# Altium footprint library mastermind.PCBLIB: 1061 footprints (part 1 of 67)
Each footprint in its own frame and in the unit in brackets; x right, y up, seen from the top. Pads: shape width x height; smd on the part's side, far side on the other; paste and mask are expansions set on the pad; w line width, h text height; cw(c..) or ccw(c..) is an arc to the next point about the centre after c.
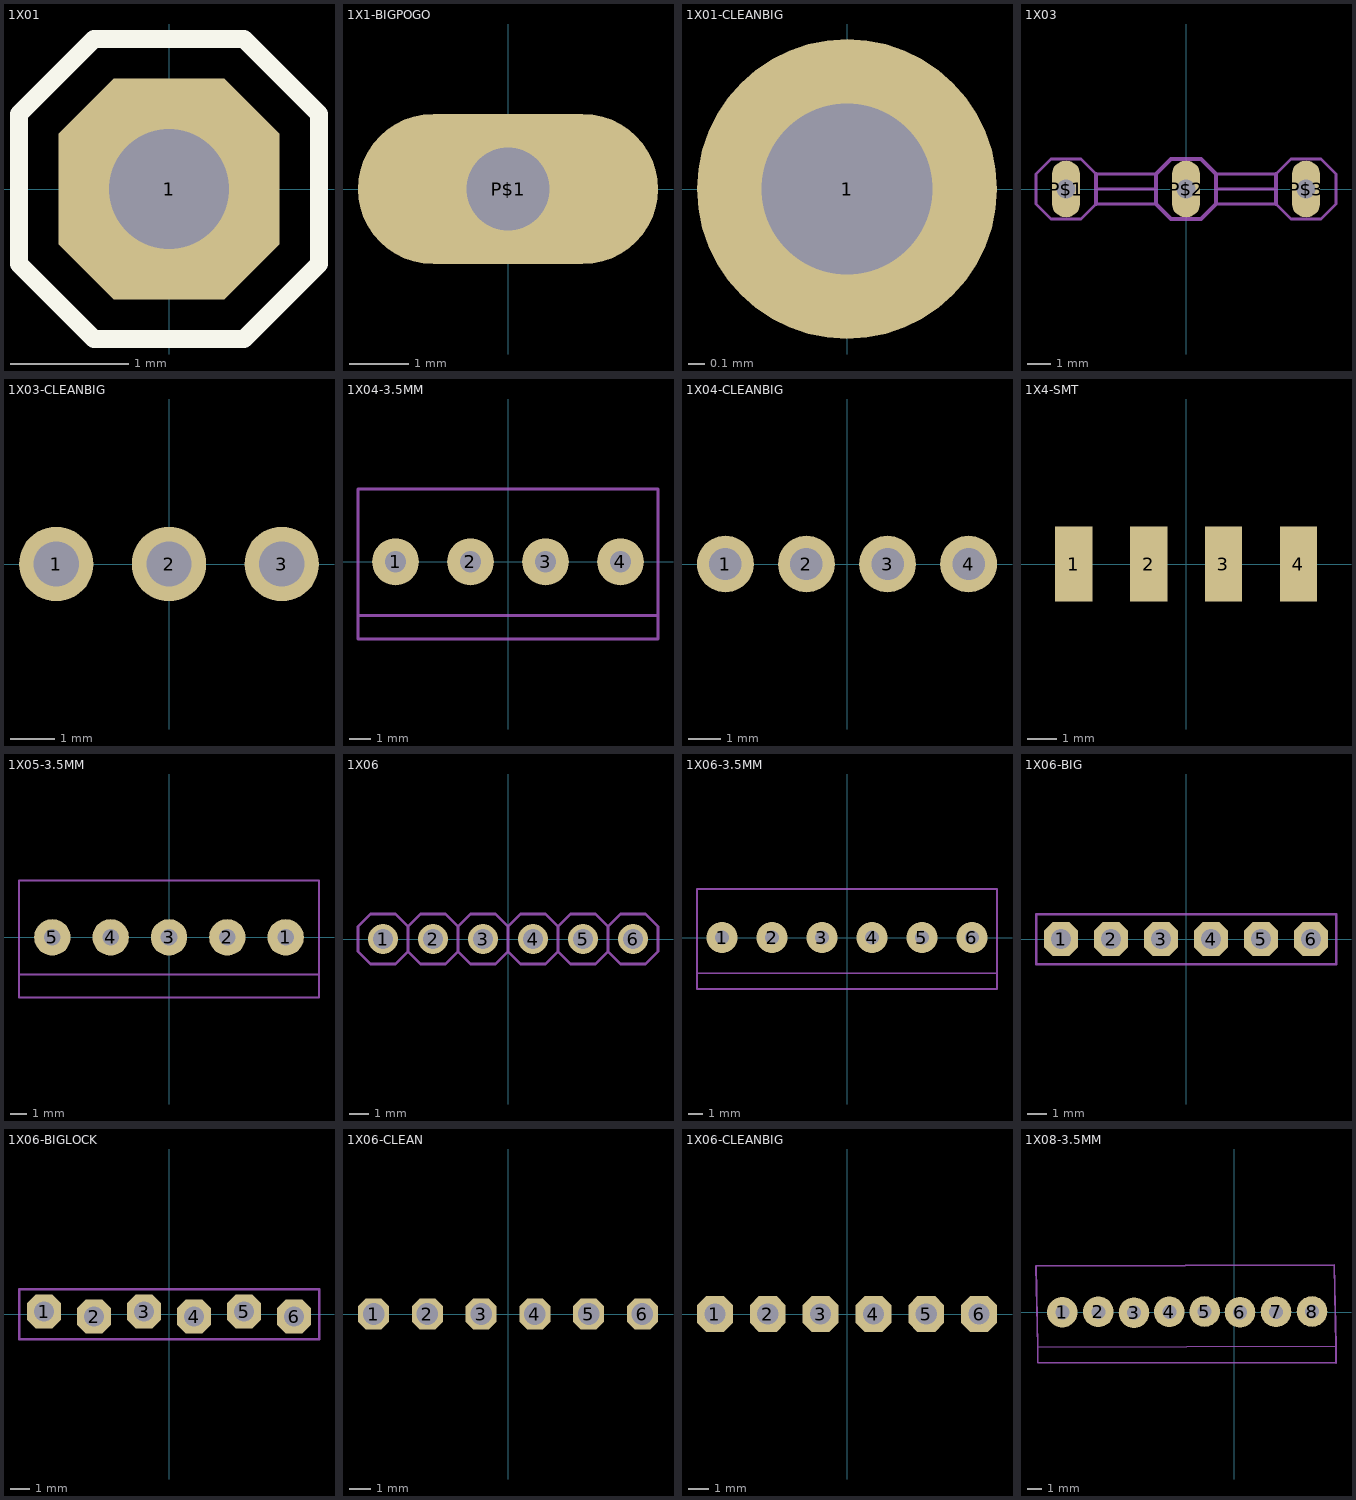
[diagram p0: the footprints below, top view; thin cyan lines are the x and y axes]

## 1X01 [mil]
pads (1):
  oct 73.59x73.59 hole 40: 1(0,0)
Top Overlay:
  lines w6: -50,-25 -25,-50 25,-50 50,-25 50,25 25,50 -25,50 -50,25 -50,-25
Mechanical 8:
  region: -10,-10 -10,10 10,10 10,-10

## 1X1-BIGPOGO [mm]
pads (1):
  oval 5.08x2.54 hole 1.4: P$1(0,0)

## 1X01-CLEANBIG [mil]
pads (1):
  round 70 hole 40: 1(0,0)

## 1X03 [mil]
pads (3):
  oval 47.25x94.5 hole 31.5: P$1(-200,0) P$2(0,0) P$3(200,0)
Mechanical 2:
  lines w5: -150,0 -50,0 ; -50,-25 -150,-25 -175,-50 -225,-50 -250,-25 -250,25 -225,50 -175,50 -150,25 -50,25 ; 50,-25 150,-25 175,-50 225,-50 250,-25 250,25 225,50 175,50 150,25 50,25 ; 50,0 150,0
  lines w6: -150,-25 -150,0 -150,25 ; 150,-25 150,0 150,25 ; -50,-25 -25,-50 25,-50 50,-25 50,0 50,25 25,50 -25,50 -50,25 -50,0 -50,-25

## 1X03-CLEANBIG [mil]
pads (3):
  round 66 hole 40: 1(-100,0) 2(0,0) 3(100,0)
Mechanical 8:
  region: 90,-10 90,10 110,10 110,-10
  region: -110,-10 -110,10 -90,10 -90,-10
  region: -10,-10 -10,10 10,10 10,-10

## 1X04-3.5MM [mil]
pads (4):
  round 86 hole 39.37: 1(-206.69,0) 2(-68.9,0) 3(68.9,0) 4(206.69,0)
Mechanical 2:
  lines w5: -275.59,-98.43 275.59,-98.43 ; -275.59,-98.43 -275.59,-141.73 275.59,-141.73 275.59,-98.43 ; -275.59,-98.43 -275.59,133.86 275.59,133.86 275.59,-98.43

## 1X04-CLEANBIG [mil]
pads (4):
  round 70 hole 40: 1(-150,0) 2(-50,0) 3(50,0) 4(150,0)
Mechanical 8:
  region: 140,-10 140,10 160,10 160,-10
  region: 40,-10 40,10 60,10 60,-10
  region: -60,-10 -60,10 -40,10 -40,-10
  region: -160,-10 -160,10 -140,10 -140,-10

## 1X4-SMT [mm]
pads (4):
  rect 1.27x2.54 smd: 1(-3.81,0) 2(-1.27,0) 3(1.27,0) 4(3.81,0)

## 1X05-3.5MM [mil]
pads (5):
  round 86 hole 39.37: 1(275.59,0) 2(137.8,0) 3(0,0) 4(-137.8,0) 5(-275.59,0)
Mechanical 2:
  lines w5: -354.33,-88.19 -354.33,133.86 354.33,133.86 354.33,-88.19 ; -354.33,-88.19 -354.33,-141.73 354.33,-141.73 354.33,-88.19 ; -354.33,-88.19 354.33,-88.19

## 1X06 [mil]
pads (6):
  round 60 hole 40: 1(-250,0) 2(-150,0) 3(-50,0) 4(50,0) 5(150,0) 6(250,0)
Mechanical 2:
  lines w6: -200,-25 -175,-50 -125,-50 -100,-25 ; -200,-25 -225,-50 -275,-50 -300,-25 -300,25 -275,50 -225,50 -200,25 ; -200,-25 -200,25 ; -200,25 -175,50 -125,50 -100,25 ; -100,-25 -100,25 ; -100,-25 -75,-50 -25,-50 0,-25 ; -100,25 -75,50 -25,50 0,25 ; 0,-25 25,-50 75,-50 100,-25 ; 0,-25 0,25 ; 0,25 25,50 75,50 100,25 ; 100,-25 125,-50 175,-50 200,-25 ; 100,-25 100,25 ; 100,25 125,50 175,50 200,25 ; 200,-25 225,-50 275,-50 300,-25 300,25 275,50 225,50 200,25 ; 200,-25 200,25
Mechanical 8:
  region: 240,-10 240,10 260,10 260,-10
  region: -260,-10 -260,10 -240,10 -240,-10
  region: -160,-10 -160,10 -140,10 -140,-10
  region: -60,-10 -60,10 -40,10 -40,-10
  region: 40,-10 40,10 60,10 60,-10
  region: 140,-10 140,10 160,10 160,-10

## 1X06-3.5MM [mil]
pads (6):
  round 86 hole 39.37: 1(-344.49,0) 2(-206.69,0) 3(-68.9,0) 4(68.9,0) 5(206.69,0) 6(344.49,0)
Mechanical 2:
  lines w5: -413.39,-98.43 413.39,-98.43 ; -413.39,-98.43 -413.39,-141.73 413.39,-141.73 413.39,-98.43 ; -413.39,-98.43 -413.39,133.86 413.39,133.86 413.39,-98.43

## 1X06-BIG [mil]
pads (6):
  oct 67.78x67.78 hole 40: 1(-250,0) 2(-150,0) 3(-50,0) 4(50,0) 5(150,0) 6(250,0)
Mechanical 2:
  lines w5: -300,-50 -300,50 300,50 300,-50 -300,-50
Mechanical 8:
  region: 240,-10 240,10 260,10 260,-10
  region: -260,-10 -260,10 -240,10 -240,-10
  region: -160,-10 -160,10 -140,10 -140,-10
  region: -60,-10 -60,10 -40,10 -40,-10
  region: 40,-10 40,10 60,10 60,-10
  region: 140,-10 140,10 160,10 160,-10

## 1X06-BIGLOCK [mil]
pads (6):
  oct 67.78x67.78 hole 40: 1(-250,5) 2(-150,-5) 3(-50,5) 4(50,-5) 5(150,5) 6(250,-5)
Mechanical 2:
  lines w5: -300,-50 300,-50 300,50 -300,50 -300,-50
Mechanical 8:
  region: 140,-10 140,10 160,10 160,-10
  region: 40,-10 40,10 60,10 60,-10
  region: -60,-10 -60,10 -40,10 -40,-10
  region: -160,-10 -160,10 -140,10 -140,-10
  region: -260,-10 -260,10 -240,10 -240,-10
  region: 240,-10 240,10 260,10 260,-10

## 1X06-CLEAN [mil]
pads (6):
  oct 58.09x58.09 hole 40: 1(-250,0) 2(-150,0) 3(-50,0) 4(50,0) 5(150,0) 6(250,0)
Mechanical 8:
  region: 140,-10 140,10 160,10 160,-10
  region: 40,-10 40,10 60,10 60,-10
  region: -60,-10 -60,10 -40,10 -40,-10
  region: -160,-10 -160,10 -140,10 -140,-10
  region: -260,-10 -260,10 -240,10 -240,-10
  region: 240,-10 240,10 260,10 260,-10

## 1X06-CLEANBIG [mil]
pads (6):
  oct 67.78x67.78 hole 40: 1(-250,0) 2(-150,0) 3(-50,0) 4(50,0) 5(150,0) 6(250,0)
Mechanical 8:
  region: 140,-10 140,10 160,10 160,-10
  region: 40,-10 40,10 60,10 60,-10
  region: -60,-10 -60,10 -40,10 -40,-10
  region: -160,-10 -160,10 -140,10 -140,-10
  region: -260,-10 -260,10 -240,10 -240,-10
  region: 240,-10 240,10 260,10 260,-10

## 1X08-3.5MM [mil]
pads (8):
  round 86 hole 39.37: 1(-482.28,0) 2(-381.19,0.99) 3(-281.09,-0.99) 4(-181.97,0.99) 5(-82.86,1.99) 6(16.25,0) 7(117.35,0.99) 8(218.44,1.99)
Mechanical 2:
  lines w5: -551.18,-98.43 -556.13,129.89 280.75,132.87 285.7,-95.45 ; -551.18,-98.43 -551.18,-141.73 285.7,-142.73 285.7,-95.45 ; -551.18,-98.43 285.7,-95.45